# Altium footprint library Hydra_Ref_pcb.PcbLib: 353 footprints (part 15 of 23)
Each footprint in its own frame and in the unit in brackets; x right, y up, seen from the top. Pads: shape width x height; smd on the part's side, far side on the other; paste and mask are expansions set on the pad; w line width, h text height; cw(c..) or ccw(c..) is an arc to the next point about the centre after c.
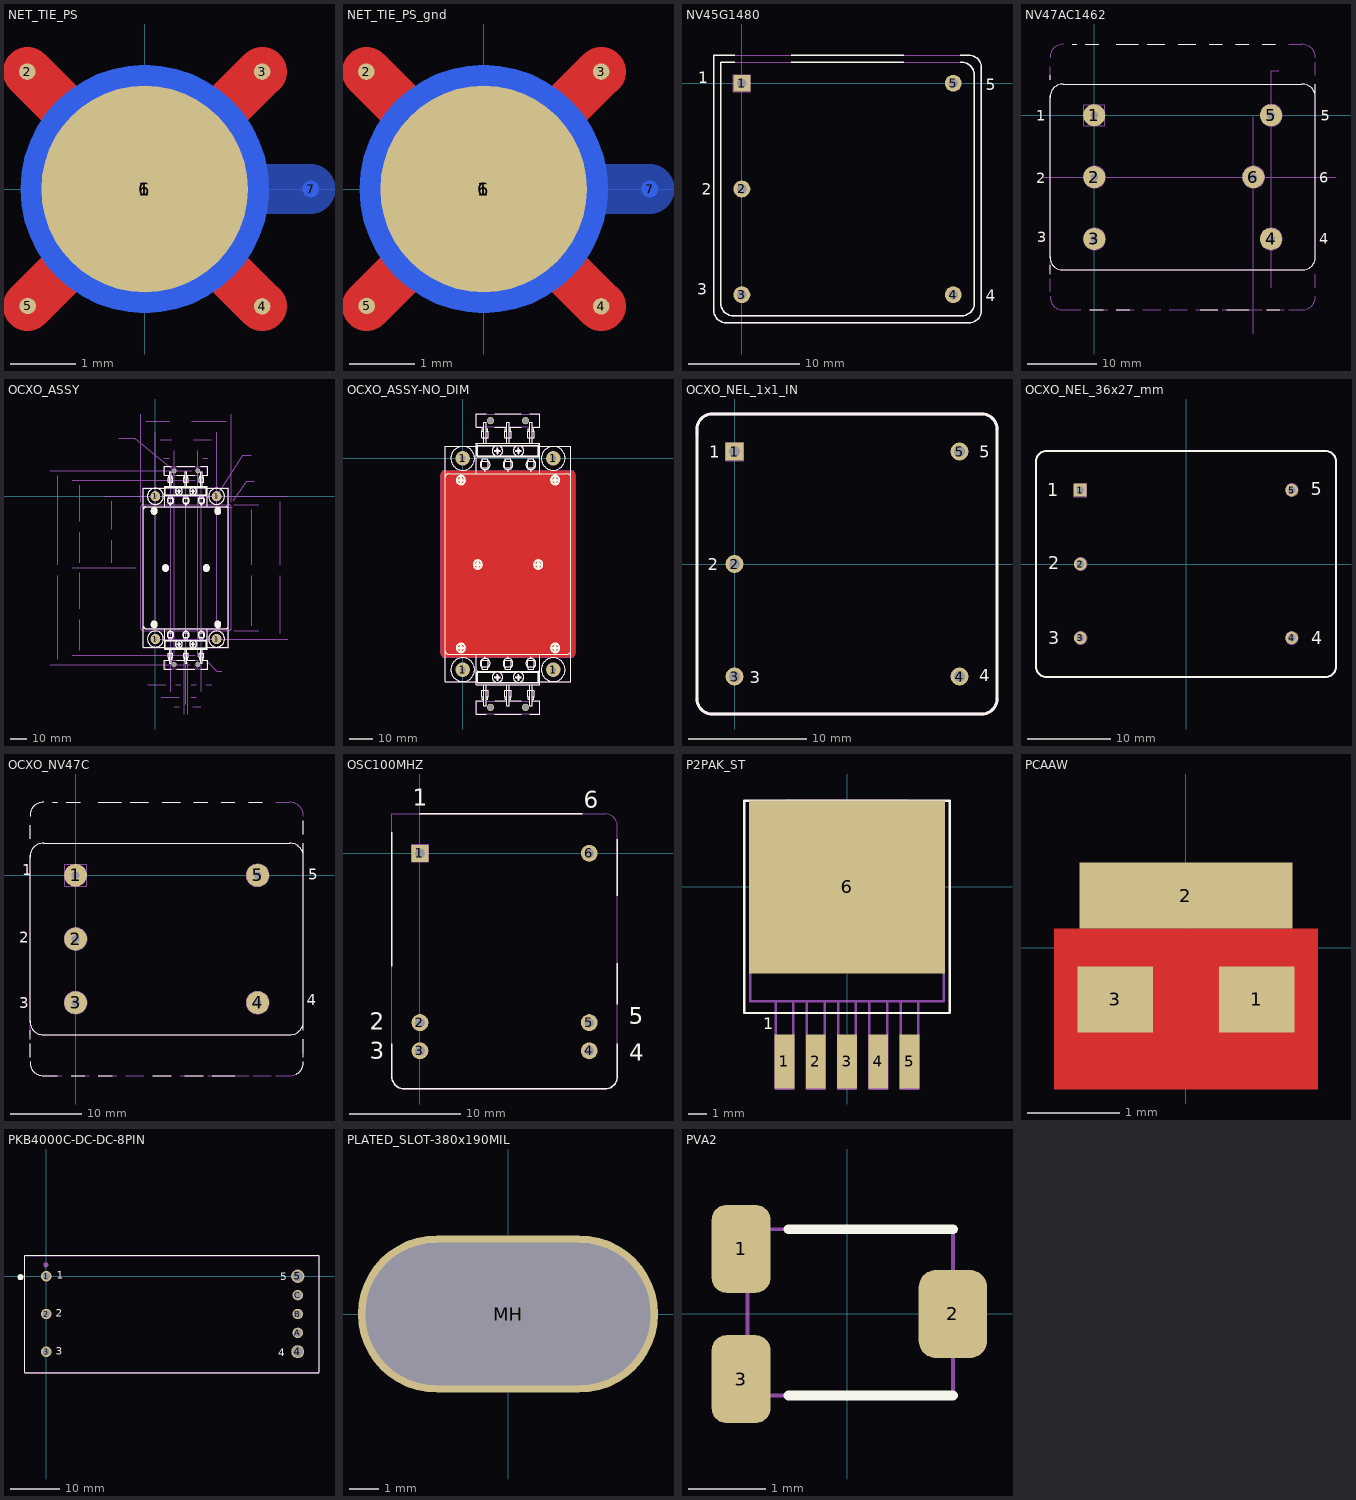
[diagram p14: the footprints below, top view; thin cyan lines are the x and y axes]

## NET_TIE_PS [mil]
height 10
pads (7):
  round 125 smd paste-62.5: 1(0,0)
  round 10 smd paste-5: 2(-70.99,70.99) 3(70.99,70.99) 4(70.99,-70.99) 5(-70.71,-70.71)
  round 150 smd far side paste-75: 6(0,0)
  round 10 smd far side paste-5: 7(100.39,0)
Top Layer:
  lines w30: -70.99,-70.99 0,0 ; -70.99,70.99 0,0 ; 70.99,-70.99 0,0 ; 70.99,70.99 0,0
Mid-Layer 1:
  circle w62.5: c0,0 r31.25
  lines w30: -70.99,-70.99 0,0 ; -70.99,70.99 0,0 ; 70.99,-70.99 0,0 ; 70.99,70.99 0,0
MidLayer3:
  circle w62.5: c0,0 r31.25
  lines w30: -70.99,-70.99 0,0 ; -70.99,70.99 0,0 ; 70.99,-70.99 0,0 ; 70.99,70.99 0,0
MidLayer2:
  circle w62.5: c0,0 r31.25
  lines w30: -70.99,-70.99 0,0 ; -70.99,70.99 0,0 ; 70.99,-70.99 0,0 ; 70.99,70.99 0,0
Bottom Layer:
  lines w30: 0,0 100.39,0
Internal Plane 1:
  lines w12: -53.67,-26.83 cw(c0,0) -53.67,26.83 ; -26.83,-53.67 ccw(c0,0) 26.83,-53.67 ; -26.83,53.67 cw(c0,0) 26.83,53.67 ; 53.67,-26.83 ccw(c0,0) 53.67,26.83
9 Top Assy:
  text ".Designator" at 3.54,-3.54 h10
  text ".Designator" at -3.54,-3.54 h10

## NET_TIE_PS_gnd [mil]
height 10
pads (7):
  round 125 smd paste-62.5: 1(0,0)
  round 10 smd paste-5: 2(-70.99,70.99) 3(70.99,70.99) 4(70.99,-70.99) 5(-70.71,-70.71)
  round 150 smd far side paste-75: 6(0,0)
  round 10 smd far side paste-5: 7(100.39,0)
Top Layer:
  lines w30: -70.99,-70.99 0,0 ; -70.99,70.99 0,0 ; 70.99,-70.99 0,0 ; 70.99,70.99 0,0
Mid-Layer 1:
  circle w62.5: c0,0 r31.25
  lines w30: -70.99,-70.99 0,0 ; -70.99,70.99 0,0 ; 70.99,-70.99 0,0 ; 70.99,70.99 0,0
MidLayer3:
  circle w62.5: c0,0 r31.25
  lines w30: -70.99,-70.99 0,0 ; -70.99,70.99 0,0 ; 70.99,-70.99 0,0 ; 70.99,70.99 0,0
MidLayer2:
  circle w62.5: c0,0 r31.25
  lines w30: -70.99,-70.99 0,0 ; -70.99,70.99 0,0 ; 70.99,-70.99 0,0 ; 70.99,70.99 0,0
Bottom Layer:
  lines w30: 0,0 100.39,0
Internal Plane 1:
  lines w12: -53.67,-26.83 cw(c0,0) -53.67,26.83 ; -26.83,-53.67 ccw(c0,0) 26.83,-53.67 ; -26.83,53.67 cw(c0,0) 26.83,53.67 ; 53.67,-26.83 ccw(c0,0) 53.67,26.83
9 Top Assy:
  text ".Designator" at 3.54,-3.54 h10
  text ".Designator" at -3.54,-3.54 h10

## NV45G1480 [mil]
pads (5):
  rect 60x60 hole 34: 1(0,0)
  round 60 hole 34: 2(0,-375) 3(0,-750) 4(750,-750) 5(750,0)
Top Overlay:
  lines w5: -25,75 -75,75 -75,-780 ccw(c-30,-780) -30,-825 785,-825 ; -25,100 -100,100 -100,-805 ccw(c-55,-805) -55,-850 805,-850 ccw(c805,-805) 850,-805 850,60 ; 175,75 575,75 ; 175,100 575,100 ; 775,74.73 784.94,74.73 cw(c780,30) 824.73,34.94 ; 775,99.73 809.94,99.73 cw(c805,55) 849.73,59.94 ; 780,-825 ccw(c780,-780) 825,-780 825,35
  text "4" at 865.2,-772.8 h40
  text "5" at 865.2,-25.2 h40
  text "2" at -142.8,-394.8 h40
  text "3" at -159.2,-750 h40
  text "1" at -154.2,0 h40
9 Top Assy:
  circle w2: c0,-375 r25
  circle w2: c0,-750 r25
  circle w2: c750,-750 r25
  circle w2: c750,0 r25
  lines w2: -100.28,-805 ccw(c-55,-805) -55,-850.28 ; -100,-805 -100,100 810,100 ; -75,-785 -75,75 785,75 ; -75,-784.97 ccw(c-30,-780) -34.97,-825 ; -55,-850 805,-850 ccw(c805,-805) 850,-805 850,60 ; -35,-825 785,-825 ; 784.97,-825 ccw(c780,-780) 825,-784.97 ; 784.94,74.73 cw(c780,30) 824.73,34.94 ; 809.94,99.73 cw(c805,55) 849.73,59.94 ; 825,-785 825,35 ; -30,-30 30,-30 30,30 -30,30 -30,-30
  text "5" at 675.4,-16.8 h40
  text "4" at 680.4,-764.4 h40
  text "2" at 50.4,-403.2 h40
  text "3" at 45.4,-772.8 h40
  text "1" at 58.8,-16.8 h40
  text ".Designator" at 349.8,-257.4 h60

## NV47AC1462 [mil] "old part"
pads (6):
  round 125 hole 43: 1(0,0) 2(0,-350) 3(0,-700) 4(1000,-700) 5(1000,0) 6(900,-350)
Top Overlay:
  lines w5: -250,-900 -250,-850 ; -250,-810 -250,110 ; -250,-799.98 ccw(c-180,-805) -174.98,-875 ; -250,99.98 cw(c-180,105) -174.98,175 ; -250,200 -250,225 ; -185,-875 1185,-875 ; -25,-1100 50,-1100 ; 125,-1100 200,-1100 ; 600,-1100 700,-1100 ; 750,-1100 875,-1100 ; 975,-1100 1050,-1100 ; 1174.98,-875 ccw(c1180,-805) 1250,-799.98 ; 1250,-805 1250,100 ccw(c1180,105) 1174.98,175 ; -175,175 1175,175 ; -175,175 1175,175 ; -175,175 1175,175 ; -125,400 -100,400 -125,400 ; -50,400 25,400 -50,400 ; 125,400 250,400 125,400 ; 300,400 400,400 300,400 ; 475,400 575,400 475,400 ; 650,400 725,400 650,400 ; 800,400 875,400 800,400 ; 950,400 1025,400 950,400 ; 1250,125 1250,175 1250,125
  text "6" at 1272.4,-380.8 h60
  text "1" at -329.5,-30.8 h60
  text "2" at -329.5,-383.6 h60
  text "3" at -321.5,-719.6 h60
  text "5" at 1281.2,-30.8 h60
  text "4" at 1272.4,-728 h60
9 Top Assy:
  circle w2: c1001.85,-700 r61.85
  circle w2: c901.85,-350 r61.85
  circle w2: c1001.85,0 r61.85
  circle w2: c1.85,-350 r61.85
  circle w2: c1.85,-700 r61.85
  lines w2: -250,-950 -250,-1000 -250,-925 ; -250,-875 -250,-825 ; -250,-810 -250,110 ; -250,-799.98 ccw(c-180,-805) -174.98,-875 ; -185,-875 1185,-875 ; -150,-1100 -75,-1100 ; -100,-1100 -175,-1100 ; -25,-1100 50,-1100 ; 0,-1100 75,-1100 ; 125,-1100 200,-1100 ; 150,-1100 225,-1100 ; 275,-1100 350,-1100 ; 300,-1100 375,-1100 ; 500,-1100 425,-1100 525,-1100 ; 575,-1100 675,-1100 ; 600,-1100 700,-1100 ; 725,-1100 800,-1100 ; 750,-1100 875,-1100 ; 850,-1100 950,-1100 ; 975,-1100 1050,-1100 ; 1000,-1100 1075,-1100 ; 1100,-1100 1125,-1100 1175,-1100 ; 1174.98,-875 ccw(c1180,-805) 1250,-799.98 ; 1250,-975 1250,-900 ; 1250,-805 1250,100 ; -174.98,-1100 cw(c-180,-1030) -250,-1024.98 ccw(c-180,-1030) -174.98,-1100 ; -174.98,175 ccw(c-180,105) -250,99.98 cw(c-180,105) -174.98,175 ; -175,175 1175,175 ; -175,175 1175,175 ; 1174.98,-1100 ccw(c1180,-1030) 1250,-1024.98 cw(c1180,-1030) 1174.98,-1100 ; 1174.98,175 cw(c1180,105) 1250,99.98 ; 1174.98,175 cw(c1180,105) 1250,99.98 ; 1174.98,400 cw(c1180,330) 1250,324.98 ccw(c1180,330) 1174.98,400 ; 1175,400 1100,400 1175,400 ; -250,200 -250,275 -250,200 ; -250,324.98 cw(c-180,330) -174.98,400 ccw(c-180,330) -250,324.98 ; -125,400 -100,400 -125,400 ; -60,-60 60,-60 60,60 -60,60 -60,-60 ; -50,400 25,400 -50,400 ; 125,400 250,400 125,400 ; 300,400 400,400 300,400 ; 475,400 575,400 475,400 ; 650,400 725,400 650,400 ; 800,400 875,400 800,400 ; 950,400 1025,400 950,400 ; 1250,125 1250,175 1250,125 ; 1250,225 1250,300 1250,225
  text ".Designator" at 142.8,-378 h60
  text "1" at -156.3,-30.4 h60
  text "2" at -151.3,-375.4 h60
  text "3" at -151.3,-730.4 h60
  text "5" at 858.7,-30.4 h60
  text "6" at 753.7,-380.4 h60
  text "4" at 858.7,-730.4 h60
22 Part Dimentions & Info:
  lines w1: -287.5,-350 1367.5,-350 ; 900,-1235 900,-7.5 ; 1000,-975 1000,252.5 ; 1002.5,252.5 1045,252.5

## OCXO_ASSY [mil] "Top side cable height is .850\""
height 850
pads (8):
  round 240 hole 93: 1(0,-3500) 1(0,0) 1(1500,-3500) 1(1500,0)
  round 120 / inner round 120 / far side round 240 hole 93: 1(460,-4125) 1(460,625) 1(1040,-4125) 1(1040,625)
Top Overlay:
  drawing of 1241 lines, arcs and shapes, not listed
1 Board Outline:
  lines w0: -360,-3235 ccw(c-300,-3235) -300,-3295 1800,-3295 ccw(c1800,-3235) 1860,-3235 1860,-265 ccw(c1800,-265) 1800,-205 -300,-205 ccw(c-300,-265) -360,-265 -360,-3235
9 Top Assy:
  drawing of 1236 lines, arcs and shapes, not listed
  text ".Designator" at 1340.3,-3892.92 h80
22 Part Dimentions & Info:
  drawing of 394 lines, arcs and shapes, not listed
  text "BOARD MOUNTING INFO" at -905.6,-5684.2 h90
  text "2.1475" at -2046.18,-788.75 h90
  text "2.1475" at -2046.18,-2936.25 h90
  text ".3750" at 1463.54,-4663.28 h90
  text ".3750" at -573.41,-4663.28 h90
  text ".0850" at 1194.17,-5203.4 h90
  text ".0425" at -241.9,-4968.87 h90
  text "1.7500" at -1263.73,-987.5 h90
  text "4.7500" at -2583.82,-1862.5 h90
  text "24X 2205.0240" at 1707.84,-4335.43 h90
  text "4X 2205.0930" at -1563.31,1383.09 h90
  text "4X 2205.0930" at 2435.1,963.92 h90
  text "4X R.0600" at 2507.08,324.02 h90
  text "2.2200" at 435.43,1794.36 h90
  text "1.5000" at 466.29,1340.68 h90
  text ".5800" at 468,889.46 h90
  text "3.5000" at 2874.3,-1862.5 h90
  text "3.0900" at 2171.78,-1862.5 h90
3D body: height 588, standoff 0, extent -295,-3244 1795,-250
3D body: height 700, standoff 0, extent 250,-255 1262.5,210
3D body: height 700, standoff 0, extent 237.5,-3710 1249.99,-3295
3D body: height 370, standoff 0, extent -292.5,-3245 1792.5,-250

## OCXO_ASSY-NO_DIM [mil]
height 850
pads (8):
  round 240 / inner round 0 / far side round 240 hole 93: 1(0,-3500) 1(0,0) 1(1500,-3500) 1(1500,0)
  round 120 / inner round 0 / far side round 240 hole 93: 1(460,-4125) 1(460,625) 1(1040,-4125) 1(1040,625)
Top Layer:
  pour cut-out: -300,-205 1800,-205 1805.91,-205 1817.5,-207.31 1828.42,-211.83 1838.25,-218.4 1846.61,-226.75 1853.17,-236.58 1857.7,-247.5 1860,-259.09 1860,-265 1860,-3235 1860,-3240.91 1857.7,-3252.5 1853.17,-3263.42 1846.61,-3273.25 1838.25,-3281.61 1828.42,-3288.17 1817.5,-3292.7 1805.91,-3295 1800,-3295 -300,-3295 -305.91,-3295 -317.5,-3292.7 -328.42,-3288.17 -338.25,-3281.61 -346.6,-3273.25 -353.17,-3263.42 -357.69,-3252.5 -360,-3240.91 -360,-3235 -360,-265 -360,-259.09 -357.69,-247.5 -353.17,-236.58 -346.6,-226.75 -338.25,-218.4 -328.42,-211.83 -317.5,-207.31 -305.91,-205
Mid-Layer 1:
  pour cut-out: -300,-205 1800,-205 1805.91,-205 1817.5,-207.31 1828.42,-211.83 1838.25,-218.4 1846.61,-226.75 1853.17,-236.58 1857.7,-247.5 1860,-259.09 1860,-265 1860,-3235 1860,-3240.91 1857.7,-3252.5 1853.17,-3263.42 1846.61,-3273.25 1838.25,-3281.61 1828.42,-3288.17 1817.5,-3292.7 1805.91,-3295 1800,-3295 -300,-3295 -305.91,-3295 -317.5,-3292.7 -328.42,-3288.17 -338.25,-3281.61 -346.6,-3273.25 -353.17,-3263.42 -357.69,-3252.5 -360,-3240.91 -360,-3235 -360,-265 -360,-259.09 -357.69,-247.5 -353.17,-236.58 -346.6,-226.75 -338.25,-218.4 -328.42,-211.83 -317.5,-207.31 -305.91,-205
MidLayer3:
  pour cut-out: -300,-205 1800,-205 1805.91,-205 1817.5,-207.31 1828.42,-211.83 1838.25,-218.4 1846.61,-226.75 1853.17,-236.58 1857.7,-247.5 1860,-259.09 1860,-265 1860,-3235 1860,-3240.91 1857.7,-3252.5 1853.17,-3263.42 1846.61,-3273.25 1838.25,-3281.61 1828.42,-3288.17 1817.5,-3292.7 1805.91,-3295 1800,-3295 -300,-3295 -305.91,-3295 -317.5,-3292.7 -328.42,-3288.17 -338.25,-3281.61 -346.6,-3273.25 -353.17,-3263.42 -357.69,-3252.5 -360,-3240.91 -360,-3235 -360,-265 -360,-259.09 -357.69,-247.5 -353.17,-236.58 -346.6,-226.75 -338.25,-218.4 -328.42,-211.83 -317.5,-207.31 -305.91,-205
MidLayer2:
  pour cut-out: -300,-205 1800,-205 1805.91,-205 1817.5,-207.31 1828.42,-211.83 1838.25,-218.4 1846.61,-226.75 1853.17,-236.58 1857.7,-247.5 1860,-259.09 1860,-265 1860,-3235 1860,-3240.91 1857.7,-3252.5 1853.17,-3263.42 1846.61,-3273.25 1838.25,-3281.61 1828.42,-3288.17 1817.5,-3292.7 1805.91,-3295 1800,-3295 -300,-3295 -305.91,-3295 -317.5,-3292.7 -328.42,-3288.17 -338.25,-3281.61 -346.6,-3273.25 -353.17,-3263.42 -357.69,-3252.5 -360,-3240.91 -360,-3235 -360,-265 -360,-259.09 -357.69,-247.5 -353.17,-236.58 -346.6,-226.75 -338.25,-218.4 -328.42,-211.83 -317.5,-207.31 -305.91,-205
Bottom Layer:
  pour cut-out: -300,-205 1800,-205 1805.91,-205 1817.5,-207.31 1828.42,-211.83 1838.25,-218.4 1846.61,-226.75 1853.17,-236.58 1857.7,-247.5 1860,-259.09 1860,-265 1860,-3235 1860,-3240.91 1857.7,-3252.5 1853.17,-3263.42 1846.61,-3273.25 1838.25,-3281.61 1828.42,-3288.17 1817.5,-3292.7 1805.91,-3295 1800,-3295 -300,-3295 -305.91,-3295 -317.5,-3292.7 -328.42,-3288.17 -338.25,-3281.61 -346.6,-3273.25 -353.17,-3263.42 -357.69,-3252.5 -360,-3240.91 -360,-3235 -360,-265 -360,-259.09 -357.69,-247.5 -353.17,-236.58 -346.6,-226.75 -338.25,-218.4 -328.42,-211.83 -317.5,-207.31 -305.91,-205
Top Overlay:
  drawing of 1241 lines, arcs and shapes, not listed
Internal Plane 1:
  pour cut-out: -300,-205 1800,-205 1805.91,-205 1817.5,-207.31 1828.42,-211.83 1838.25,-218.4 1846.61,-226.75 1853.17,-236.58 1857.7,-247.5 1860,-259.09 1860,-265 1860,-3235 1860,-3240.91 1857.7,-3252.5 1853.17,-3263.42 1846.61,-3273.25 1838.25,-3281.61 1828.42,-3288.17 1817.5,-3292.7 1805.91,-3295 1800,-3295 -300,-3295 -305.91,-3295 -317.5,-3292.7 -328.42,-3288.17 -338.25,-3281.61 -346.6,-3273.25 -353.17,-3263.42 -357.69,-3252.5 -360,-3240.91 -360,-3235 -360,-265 -360,-259.09 -357.69,-247.5 -353.17,-236.58 -346.6,-226.75 -338.25,-218.4 -328.42,-211.83 -317.5,-207.31 -305.91,-205
1 Board Outline:
  lines w0: -360,-3235 ccw(c-300,-3235) -300,-3295 1800,-3295 ccw(c1800,-3235) 1860,-3235 1860,-265 ccw(c1800,-265) 1800,-205 -300,-205 ccw(c-300,-265) -360,-265 -360,-3235
9 Top Assy:
  drawing of 1236 lines, arcs and shapes, not listed
  text ".Designator" at 1340.3,-3892.92 h80
3D body: height 588, standoff 0, extent -295,-3244 1795,-250
3D body: height 700, standoff 0, extent 237.5,-3710 1250,-3295
3D body: height 700, standoff 0, extent 250,-255 1262.5,210
3D body: height 370, standoff 0, extent -359.66,-3295.03 1860.24,-205.19

## OCXO_NEL_1x1_IN [mil]
height 750
pads (5):
  rect 60x60 hole 36 mask+12: 1(0,375)
  round 60 / inner round 60 / far side round 80 hole 36: 2(0,0) 3(0,-375) 4(750,-375) 5(750,375)
Top Overlay:
  lines w10: -125,425 -125,450 cw(c-75,450) -75,500 825,500 cw(c825,450) 875,450 875,-450 cw(c825,-450) 825,-500 -75,-500 cw(c-75,-450) -125,-450 -125,430
  text "4" at 815,-390 h40
  text "5" at 815,355 h40
  text "2" at -90,-20 h40
  text "3" at 50.4,-397.8 h40
  text "1" at -85,355 h40
9 Top Assy:
  circle w2: c0,0 r25
  circle w2: c0,-375 r25
  circle w2: c750,-375 r25
  circle w2: c750,375 r25
  lines w2: -30,345 30,345 30,405 -30,405 -30,345
  lines w5: -125,-450 -125,430 ; 875,-450 875,450
  lines w10: -125,-450 ccw(c-75,-450) -75,-500 825,-500 ccw(c825,-450) 875,-450 ; -125,425 -125,450 cw(c-75,450) -75,500 825,500 cw(c825,450) 875,450
  text "5" at 675.4,358.2 h40
  text "4" at 680.4,-389.4 h40
  text "2" at 50.4,-28.2 h40
  text "3" at 50.4,-397.8 h40
  text "1" at 58.8,358.2 h40
  text ".Designator" at 170,-35 h60
3D body: height 750, standoff 0, extent -125,-500 875,500

## OCXO_NEL_36x27_mm [mil] "OCXO"
height 630
pads (5):
  rect 60x60 / inner rect 60x60 / far side rect 80x80 hole 36: 1(-500,350)
  round 60 / inner round 60 / far side round 80 hole 36: 2(-500,0) 3(-500,-350) 5(500,350)
  round 60 hole 36 mask+12: 4(500,-350)
Top Overlay:
  lines w10: -710,-485 ccw(c-660,-485) -660,-535 660,-535 ccw(c660,-485) 710,-485 710,485 ccw(c660,485) 660,535 -660,535 ccw(c-660,485) -710,485 -710,-485
  text "4" at 592,-380.8 h60
  text "5" at 589.8,324.8 h60
  text "3" at -652,-380 h60
  text "2" at -651.5,-25.6 h60
  text "1" at -657,320 h60
9 Top Assy:
  circle w2: c-498.15,-350 r30
  circle w2: c-498.15,0 r30
  circle w2: c501.85,350 r30
  circle w2: c501.85,-350 r30
  lines w2: -531,319 -531,381 -469,381 -469,319 -531,319
  lines w5: -710,485 cw(c-660,485) -660,535 ; -710,485 cw(c-660,485) -660,535 ; -710,485 -710,-485 ccw(c-660,-485) -660,-535 660,-535 ccw(c660,-485) 710,-485 710,485 ccw(c660,485) 660,535 -660,535
  text ".Designator" at -274,-25.4 h60
  text "5" at 592,324.8 h60
  text "4" at 592,-380.8 h60
  text "3" at -651.3,-380.4 h60
  text "2" at -651.3,-25.4 h60
  text "1" at -656.3,319.6 h60
3D body: height 630, standoff 0, extent -710,-535 710,535

## OCXO_NV47C [mil] "old part"
pads (5):
  round 125 hole 43: 1(0,0) 2(0,-350) 3(0,-700) 4(1000,-700) 5(1000,0)
Top Overlay:
  lines w5: -250,-1024.98 ccw(c-180,-1030) -174.98,-1100 -100,-1100 ; -250,-1000 -250,-925 ; -250,-900 -250,-850 ; -250,-810 -250,110 ; -250,-799.98 ccw(c-180,-805) -174.98,-875 ; -250,99.98 cw(c-180,105) -174.98,175 ; -185,-875 1185,-875 ; -25,-1100 50,-1100 ; 125,-1100 200,-1100 ; 425,-1100 525,-1100 ; 600,-1100 700,-1100 ; 750,-1100 875,-1100 ; 1174.98,-875 ccw(c1180,-805) 1250,-799.98 ; 1211.38,-1092.77 ccw(c1180,-1030) 1250,-1024.98 ; 1250,-1000 1250,-900 ; 1250,-850 1250,-775 ; 1250,-805 1250,100 ccw(c1180,105) 1174.98,175 ; -175,175 1175,175 ; -175,175 1175,175 ; -175,175 1175,175 ; -250,200 -250,275 -250,200 ; -250,324.98 cw(c-180,330) -174.98,400 ccw(c-180,330) -250,324.98 ; -125,400 -100,400 -125,400 ; -50,400 25,400 -50,400 ; 125,400 250,400 125,400 ; 300,400 400,400 300,400 ; 475,400 575,400 475,400 ; 650,400 725,400 650,400 ; 800,400 875,400 800,400 ; 950,400 1025,400 950,400 ; 1250,125 1250,175 1250,125 ; 1250,225 1250,300 1250,225
  text "5" at 1276.8,-25.2 h60
  text "4" at 1268.8,-714 h60
  text "2" at -310.8,-369.6 h60
  text "1" at -294,0 h60
  text "3" at -310.8,-730.8 h60
1 Board Outline:
  circle w10: c1000,-700 r60
  circle w10: c1000,0 r60
  circle w10: c0,-700 r60
  circle w10: c0,-350 r60
9 Top Assy:
  lines w2: -250,-950 -250,-1000 -250,-925 ; -250,-875 -250,-825 ; -250,-810 -250,110 ; -250,-799.98 ccw(c-180,-805) -174.98,-875 ; -185,-875 1185,-875 ; -150,-1100 -75,-1100 ; -100,-1100 -175,-1100 ; -25,-1100 50,-1100 ; 0,-1100 75,-1100 ; 125,-1100 200,-1100 ; 150,-1100 225,-1100 ; 275,-1100 350,-1100 ; 300,-1100 375,-1100 ; 500,-1100 425,-1100 525,-1100 ; 575,-1100 675,-1100 ; 600,-1100 700,-1100 ; 725,-1100 800,-1100 ; 750,-1100 875,-1100 ; 850,-1100 950,-1100 ; 975,-1100 1050,-1100 ; 1000,-1100 1075,-1100 ; 1100,-1100 1125,-1100 1175,-1100 ; 1174.98,-875 ccw(c1180,-805) 1250,-799.98 ; 1250,-975 1250,-900 ; 1250,-805 1250,100 ; -174.98,-1100 cw(c-180,-1030) -250,-1024.98 ccw(c-180,-1030) -174.98,-1100 ; -174.98,175 ccw(c-180,105) -250,99.98 cw(c-180,105) -174.98,175 ; -175,175 1175,175 ; -175,175 1175,175 ; 1174.98,-1100 ccw(c1180,-1030) 1250,-1024.98 cw(c1180,-1030) 1174.98,-1100 ; 1174.98,175 cw(c1180,105) 1250,99.98 ; 1174.98,175 cw(c1180,105) 1250,99.98 ; 1174.98,400 cw(c1180,330) 1250,324.98 ccw(c1180,330) 1174.98,400 ; 1175,400 1100,400 1175,400 ; -250,200 -250,275 -250,200 ; -250,324.98 cw(c-180,330) -174.98,400 ccw(c-180,330) -250,324.98 ; -125,400 -100,400 -125,400 ; -60,-60 60,-60 60,60 -60,60 -60,-60 ; -50,400 25,400 -50,400 ; 125,400 250,400 125,400 ; 300,400 400,400 300,400 ; 475,400 575,400 475,400 ; 650,400 725,400 650,400 ; 800,400 875,400 800,400 ; 950,400 1025,400 950,400 ; 1250,125 1250,175 1250,125 ; 1250,225 1250,300 1250,225
  text "4" at 1092,-730.8 h60
  text "5" at 1092,-25.2 h60
  text "3" at 84.4,-738.8 h60
  text "2" at -126,-369.6 h60
  text "1" at 92.4,-25.2 h60
  text ".Designator" at 327.6,-377.6 h60

## OSC100MHZ [mil] "old part"
pads (6):
  rect 60x60 hole 34: 1(0,0)
  round 60 hole 34: 2(0,-600) 3(0,-700) 4(600,-700) 5(600,-600) 6(600,0)
Top Overlay:
  lines w5: -100,-675 -100,-790 ccw(c-55,-790) -55,-835 660,-835 ; -100,-400 -100,75 ; 0,140 575,140 ; 655,-835 ccw(c655,-790) 700,-790 700,-675 ; 700,-535 700,-390 ; 700,-150 700,50
  text "2" at -177.4,-626.1 h60
  text "4" at 741.4,-734.8 h60
  text "1" at -25.2,168 h60
  text "3" at -177.4,-729.1 h60
  text "6" at 579.6,160 h60
  text "5" at 740.4,-606.3 h60
1 Board Outline:
  lines w5: -30,-30 -30,30 30,30 30,-30 -30,-30
9 Top Assy:
  circle w2: c600,0 r25.5
  circle w2: c600,-600 r25.5
  circle w2: c600,-700 r25.5
  circle w2: c0,-700 r25.5
  circle w2: c0,-600 r25.5
  lines w2: -100.28,-790 ccw(c-55,-790) -55,-835.28 ; -100,-790 -100,140 660,140 ; -55,-835 660,-835 ; 655,-835 ccw(c655,-790) 700,-790 ; 659.94,139.73 cw(c655,95) 699.73,99.94 ; 700,-795 700,100
  text ".Designator" at 151.2,-336 h60
  text "4" at 513,-774.3 h60
  text "5" at 513,-631.8 h60
  text "6" at 513,-31.8 h60
  text "3" at 33,-774.3 h60
  text "2" at 48,-629.3 h60
  text "1" at 53,-24.3 h60

## P2PAK_ST [mil]
height 180
pads (6):
  rect 42x116.14 smd: 1(-134,-374.02) 2(-67,-374.02) 3(0,-374.02) 4(67,-374.02) 5(134,-374.02)
  rect 420x370 smd: 6(0,0)
Top Overlay:
  lines w5: -220,-270 -220,185 220,185 220,-270 -220,-270
  text "1" at -180,-305 h25
9 Top Assy:
  lines w5: -207.5,125 207.5,125 207.5,-120 ; -153,-339 -115,-339 ; -153,-245 -153,-340 -153,-433.07 -115,-433.07 -115,-340 -115,-245 ; -150,-97.5 -150,-120 -142.5,-120 ; -150,-77.5 -150,-55 ; -150,-35 -150,-12.5 ; -150,7.5 -150,30 ; -150,50 -150,72.5 ; -150,92.5 -150,115 ; -122.5,-120 -100,-120 ; -86,-339 -48,-339 ; -86,-245 -86,-340 -86,-433.07 -48,-433.07 -48,-340 -48,-245 ; -80,-120 -57.5,-120 ; -37.5,-120 -15,-120 ; -19,-339 19,-339 ; -19,-245 -19,-340 -19,-433.07 19,-433.07 19,-340 19,-245 ; 5,-120 27.5,-120 ; 47.5,-120 70,-120 ; 48,-339 86,-339 ; 48,-245 48,-340 48,-433.07 86,-433.07 86,-340 86,-245 ; 90,-120 112.5,-120 ; 115,-339 153,-339 ; 115,-245 115,-340 115,-433.07 153,-433.07 153,-340 153,-245 ; 132.5,-120 150,-120 150,-97.5 ; 150,-77.5 150,-55 ; 150,-35 150,-12.5 ; 150,7.5 150,30 ; 150,50 150,72.5 ; 150,92.5 150,115 ; -207.5,-245 207.5,-245 207.5,164 128,185 -128,185 -207.5,164 -207.5,-245
  text "5" at 128,-415 h20
  text "4" at 60,-415 h20
  text "1" at -140,-415 h20
  text ".Designator" at -90,-20 h30
  text "2" at -75,-415 h20
  text "3" at -5,-415 h20
3D body: height 180, standoff 0.01, extent -208,-260 207.5,110
3D body: height 55, standoff 0.01, extent -207.5,110 207.5,170

## PADVIALIBRARY.LIBRARYID={93FDA5EF-7159-4B1C-B6E3-57E7386F5D20} [mil]

## PCAAW [mil] "ATTENUATOR, 0806"
height 10
pads (3):
  rect 32x28 smd mask+2: 1(29.98,-22) 3(-30,-22)
  rect 90.55x28 smd: 2(0,22)
Top Layer:
  pour cut-out: 56,8 -56,8 -56,-60 56,-60
Top Solder:
  pour cut-out: -57,47 57,47 57,-45 28,-45 28,-6 -29,-6 -29,-45 -57,-45
9 Top Assy:
  lines w2: -40,-10 -20,-10 -20,-34 ; -40,10 40,10 ; 20,-34 20,-10 40,-10 ; -40,-34 40,-34 40,25 -40,25 -40,-34
  text ".Designator" at -26,-8 h15
13 Top 3D Bodies:
  lines w2: -39.5,-34 -20,-34 -20,-10 -39.5,-10 -39.5,-34 ; -39.5,10 39.5,10 39.5,25 -39.5,25 -39.5,10 ; 20,-34 39.5,-34 39.5,-10 20,-10 20,-34
3D body: height 1.5, standoff 0, extent 20.02,-34 39.48,-10.02
3D body: height 11.5, standoff 0, extent -39.48,10.02 39.48,24.98
3D body: height 1.5, standoff 0, extent -39.48,-34 -20.02,-10.02
3D body: height 10, standoff 1.5, extent -39.98,-34 39.98,23

## PKB4000C-DC-DC-8PIN [mil] "PKB4000C-DC-DC-8PIN"
height 468.5
pads (8):
  round 83 hole 63: 1(0,0) 2(0,-300) 3(0,-600) A(2000,-450) B(2000,-300) C(2000,-150)
  round 103 hole 83: 4(2000,-600)
  round 105 hole 83: 5(2000,0)
Top Overlay:
  circle w25: c-205,-7 r12
  lines w5: -169.29,-766.54 2167,-766.54 ; -169.29,-764 -169.29,164.57 ; -169.29,166.54 2167,166.54 ; 2167,164.57 2169.29,162.28 2169.29,-764
  text "5" at 1862,-33 h60
  text "4" at 1847,-638 h60
  text "3" at 76,-625 h60
  text "2" at 76,-321 h60
  text "1" at 82,-21 h60
9 Top Assy:
  lines w2: -169.29,-764 -169.29,164.57 2169.29,164.57 2169.29,-764 -169.29,-764
  text ".Designator" at 693,-349 h80
13 Top 3D Bodies:
  lines w3: -169.29,-766.54 -169.29,164.57 2169.29,164.57 2169.29,-766.54 -169.29,-766.54
15 Top Optical Placement:
  circle w20: c-4,91 r10
3D body: height 468.5, standoff 0, extent -169.29,-766.54 2171.71,161.03

## PLATED_SLOT-380x190MIL [mil] "PLATED SLOT;380x190MIL"
height 0.1
pads (1):
  oval 400x210 hole 190 slot 380 at 0 deg: MH(0,0)

## PVA2 [mil] "old part"
height 68.9
pads (3):
  rrect50% 30x45 smd: 1(-54.13,33.31) 3(-54.13,-33.31)
  rrect50% 35x45 smd: 2(54.13,0)
Top Overlay:
  lines w5: -29.87,-41.69 54.13,-41.69 ; -29.87,43.31 54.13,43.31
9 Top Assy:
  lines w2: -50.87,-42.69 cw(c-50.87,-34.69) -50.87,-26.69 ; -50.87,28.31 cw(c-50.87,36.31) -50.87,44.31 ; 54.13,-7.69 ccw(c54.13,0.31) 54.13,8.31 ; -50.87,-41.69 -50.87,43.31 54.13,43.31 54.13,-41.69 -50.87,-41.69
  text ".Designator" at -45.28,-8.4 h27
3D body: height 68.9, standoff 0, extent -101.6,-75.6 100.8,75.6